# Altium footprint library lib_protel_HC.PCBLIB: 724 footprints (part 40 of 46)
Each footprint in its own frame and in the unit in brackets; x right, y up, seen from the top. Pads: shape width x height; smd on the part's side, far side on the other; paste and mask are expansions set on the pad; w line width, h text height; cw(c..) or ccw(c..) is an arc to the next point about the centre after c.
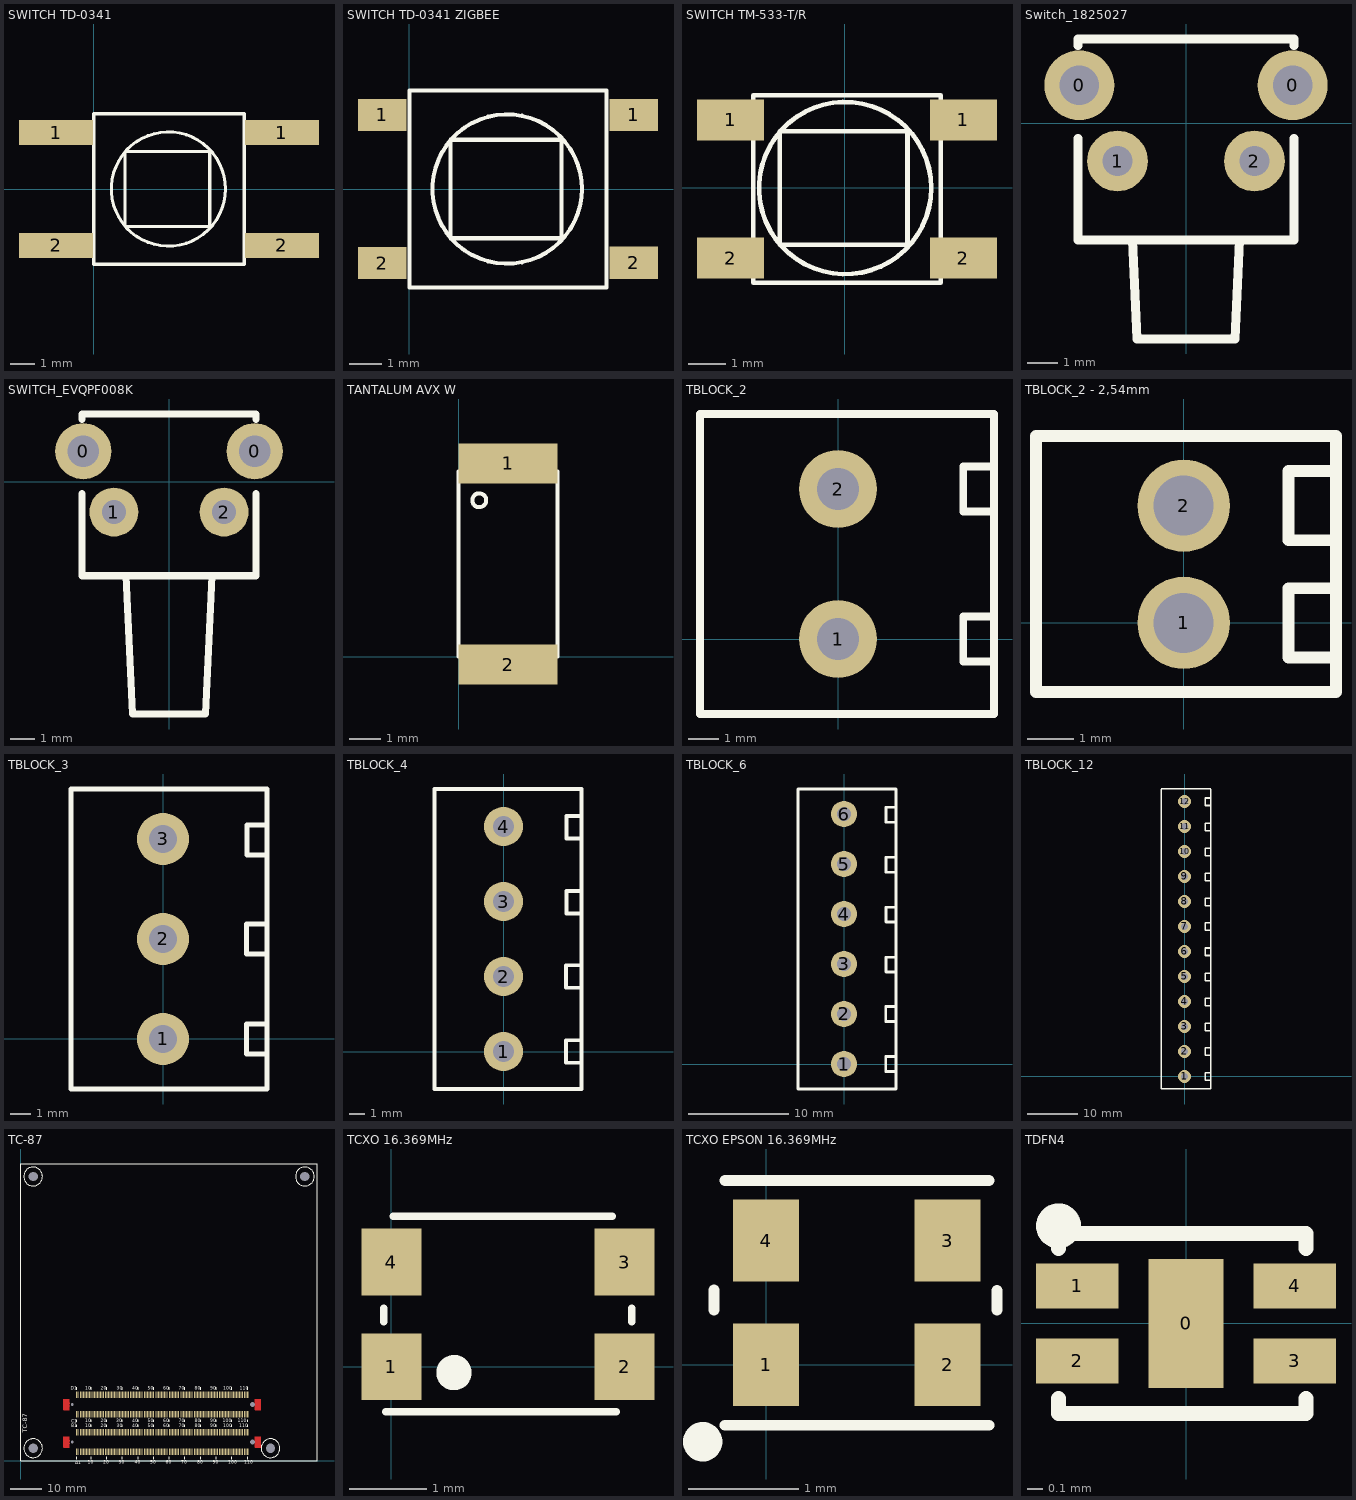
[diagram p39: the footprints below, top view; thin cyan lines are the x and y axes]

## SWITCH TD-0341 [mm] "TACT DE E-COMPONENTS TD-0341"
height 7
pads (4):
  rect 3x1 smd: 1(-1.524,2.286) 1(7.62,2.286) 2(-1.524,-2.286) 2(7.62,-2.286)
Top Overlay:
  circle w0.127: c3.023,0 r2.311
  lines w0.127: 0,-3.048 0,3.048 6.096,3.048 6.096,-3.048 0,-3.048 ; 1.27,-1.524 1.27,1.524 4.699,1.524 4.699,-1.524 1.27,-1.524

## SWITCH TD-0341 ZIGBEE [mm] "TACT DE E-COMPONENTS TD-0341"
height 7
pads (4):
  rect 1.5x1 smd: 1(-0.84,2.29) 1(6.94,2.29) 2(-0.84,-2.29) 2(6.94,-2.286)
Top Overlay:
  circle w0.127: c3.023,0 r2.311
  lines w0.127: 0,-3.048 6.096,-3.048 6.096,3.048 0,3.048 0,-3.048 ; 1.27,-1.524 4.699,-1.524 4.699,1.524 1.27,1.524 1.27,-1.524

## SWITCH TM-533-T/R [mm] "microinterruptor"
height 1.5
pads (4):
  rect 1.8x1.1 smd: 1(-3.068,1.826) 1(3.18,1.826) 2(-3.068,-1.882) 2(3.18,-1.882)
Top Overlay:
  circle w0.127: c0.006,-0.003 r2.311
  lines w0.127: -2.459,-2.543 2.57,-2.543 2.57,2.486 -2.459,2.486 -2.459,-2.543 ; -1.748,-1.527 1.681,-1.527 1.681,1.521 -1.748,1.521 -1.748,-1.527

## Switch_1825027 [mm] "Switch 2 Pin angulo recto"
height 7.01
pads (4):
  round 2.3 hole 1.3: 0(-3.505,1.245) 0(3.505,1.245)
  round 2 hole 0.99: 1(-2.25,-1.245) 2(2.25,-1.245)
Top Overlay:
  lines w0.3: -3.555,-0.5 -3.555,-3.845 3.555,-3.845 3.555,-0.5 ; -3.555,2.55 -3.555,2.765 3.555,2.765 3.555,2.55 ; -1.755,-3.845 -1.605,-7.095 1.605,-7.095 1.755,-3.845
3D body "c-1825027-8-g1-3d.stp": height 7.01, standoff -3.51, extent -4.204,-7.096 4.204,2.746

## SWITCH_EVQPF008K [mm]
height 7.4
pads (4):
  round 2.3 hole 1.3: 0(-3.505,1.245) 0(3.505,1.245)
  round 2 hole 0.99: 1(-2.25,-1.245) 2(2.25,-1.245)
Top Overlay:
  lines w0.3: -3.555,-0.5 -3.555,-3.845 3.555,-3.845 3.555,-0.5 ; -3.555,2.55 -3.555,2.765 3.555,2.765 3.555,2.55 ; -1.755,-3.845 -1.494,-9.5 1.494,-9.5 1.755,-3.845
3D body "c-1-1825027-1-g1-3d.stp": height 7.01, standoff -3.51, extent -4.203,-9.54 4.204,2.817

## TANTALUM AVX W [mm]
pads (2):
  rect 3.2x1.3 smd: 1(1.6,6.25) 2(1.6,-0.25)
Top Overlay:
  circle w0.127: c0.67,5.06 r0.225
  lines w0.127: 0,0 3.2,0 3.2,6 0,6 0,0

## TBLOCK_2 [mm] "TERMIANL BLOCK 2 VIAS"
height 16.5
pads (2):
  round 2.6 hole 1.4: 1(0,0) 2(0,5)
Top Overlay:
  lines w0.254: 5.173,-0.75 4.173,-0.75 4.173,0.75 5.173,0.75 ; 5.173,4.25 4.173,4.25 4.173,5.75 5.173,5.75 ; -4.6,-2.5 -4.6,7.5 5.2,7.5 5.2,-2.5 -4.6,-2.5
3D body "1711026.stp": height 18, standoff -5, extent -5.7,-3.085 5.5,7.485

## TBLOCK_2 - 2,54mm [mm] "TERMIANL BLOCK 2 VIAS 2,54 mm pitch"
height 8
pads (2):
  round 2 hole 1.3: 1(0,0) 2(0,2.54)
Top Overlay:
  lines w0.254: 3.25,0.75 2.273,0.75 2.273,-0.75 3.3,-0.75 ; 3.25,3.29 2.273,3.29 2.273,1.79 3.3,1.79 ; -3.2,-1.5 -3.2,4.05 3.3,4.05 3.3,-1.5 -3.2,-1.5

## TBLOCK_3 [mm] "TERMINAL BLOCK 3 VIAS"
height 16.5
pads (3):
  round 2.6 hole 1.4: 1(0,0) 2(0,5) 3(0,10)
Top Overlay:
  lines w0.254: -4.6,-2.5 5.2,-2.5 5.2,12.5 -4.6,12.5 ; 5.173,-0.75 4.173,-0.75 4.173,0.75 5.173,0.75 ; 5.173,4.25 4.173,4.25 4.173,5.75 5.173,5.75 ; 5.2,9.198 4.2,9.198 4.2,10.698 5.2,10.698
  lines w0.255: -4.6,-2.5 -4.6,12.5
3D body "1711039.stp": height 18, standoff -5, extent -5.7,-3.06 5.5,12.51

## TBLOCK_4 [mm] "TERMINAL BLOCK 4 VIAS"
height 16.5
pads (4):
  round 2.6 hole 1.4: 1(0,0) 2(0,5) 3(0,10) 4(0,15)
Top Overlay:
  lines w0.254: -4.6,-2.5 5.2,-2.5 5.2,17.5 -4.6,17.5 ; 5.173,-0.75 4.173,-0.75 4.173,0.75 5.173,0.75 ; 5.173,4.25 4.173,4.25 4.173,5.75 5.173,5.75 ; 5.2,9.198 4.2,9.198 4.2,10.698 5.2,10.698 ; 5.2,14.198 4.2,14.198 4.2,15.698 5.2,15.698
  lines w0.255: -4.6,-2.5 -4.6,17.5

## TBLOCK_6 [mm] "TERMINAL BLOCK 6 VIAS"
height 16.5
pads (6):
  round 2.6 hole 1.4: 1(0,0) 2(0,5) 3(0,10) 4(0,15) 5(0,20) 6(0,25)
Top Overlay:
  lines w0.254: -4.6,-2.5 5.2,-2.5 5.2,27.5 -4.6,27.5 ; 5.173,-0.75 4.173,-0.75 4.173,0.75 5.173,0.75 ; 5.173,4.25 4.173,4.25 4.173,5.75 5.173,5.75 ; 5.2,9.198 4.2,9.198 4.2,10.698 5.2,10.698 ; 5.2,14.198 4.2,14.198 4.2,15.698 5.2,15.698 ; 5.2,19.166 4.2,19.166 4.2,20.666 5.2,20.666 ; 5.2,24.166 4.2,24.166 4.2,25.666 5.2,25.666
  lines w0.255: -4.6,-2.5 -4.6,27.5

## TBLOCK_12 [mm] "TERMINAL BLOCK 6 VIAS"
height 16.5
pads (12):
  round 2.6 hole 1.4: 1(0,0) 2(0,5) 3(0,10) 4(0,15) 5(0,20) 6(0,25) 7(0,30) 8(0,35) 9(0,40) 10(0,45) 11(0,50) 12(0,55)
Top Overlay:
  lines w0.254: -4.6,-2.5 5.2,-2.5 5.2,57.5 -4.6,57.5 ; 5.173,-0.75 4.173,-0.75 4.173,0.75 5.173,0.75 ; 5.173,4.25 4.173,4.25 4.173,5.75 5.173,5.75 ; 5.173,24.25 4.173,24.25 4.173,25.75 5.173,25.75 ; 5.173,29.25 4.173,29.25 4.173,30.75 5.173,30.75 ; 5.173,54.25 4.173,54.25 4.173,55.75 5.173,55.75 ; 5.2,9.198 4.2,9.198 4.2,10.698 5.2,10.698 ; 5.2,14.198 4.2,14.198 4.2,15.698 5.2,15.698 ; 5.2,19.166 4.2,19.166 4.2,20.666 5.2,20.666 ; 5.2,24.166 4.2,24.166 4.2,25.666 5.2,25.666 ; 5.2,34.198 4.2,34.198 4.2,35.698 5.2,35.698 ; 5.2,39.198 4.2,39.198 4.2,40.698 5.2,40.698 ; 5.2,44.166 4.2,44.166 4.2,45.666 5.2,45.666 ; 5.2,49.166 4.2,49.166 4.2,50.666 5.2,50.666 ; 5.2,54.166 4.2,54.166 4.2,55.666 5.2,55.666
  lines w0.255: -4.6,-2.5 -4.6,57.5

## TC-87 [mm] "TC-87"
height 25
pads (448):
  rect 0x0 hole 3: 0(4,4) 0(4,91) 0(80,4) 0(91,91)
  rect 0x0 hole 0.9: 0(16.5,6) 0(16.5,18)
  rect 0x0 hole 1.6: 0(74.2,6) 0(74.2,18)
  rect 0.45x2 smd: A1(18.025,2.9) A110(72.675,2.9) B1(18.025,9.1) B110(72.675,9.1) C1(18.025,14.9) C110(72.675,14.9) D1(18.025,21.1) D110(72.675,21.1)
  rect 0.3x2 smd: A2(18.6,2.9) A3(19.1,2.9) A4(19.6,2.9) A5(20.1,2.9) A6(20.6,2.9) A7(21.1,2.9) A8(21.6,2.9) A9(22.1,2.9) A10(22.6,2.9) A11(23.1,2.9) A12(23.6,2.9) A13(24.1,2.9) A14(24.6,2.9) A15(25.1,2.9) A16(25.6,2.9) A17(26.1,2.9) A18(26.6,2.9) A19(27.1,2.9) A20(27.6,2.9) A21(28.1,2.9) A22(28.6,2.9) A23(29.1,2.9) A24(29.6,2.9) A25(30.1,2.9) A26(30.6,2.9) A27(31.1,2.9) A28(31.6,2.9) A29(32.1,2.9) A30(32.6,2.9) A31(33.1,2.9) A32(33.6,2.9) A33(34.1,2.9) A34(34.6,2.9) A35(35.1,2.9) A36(35.6,2.9) A37(36.1,2.9) A38(36.6,2.9) A39(37.1,2.9) A40(37.6,2.9) A41(38.1,2.9) A42(38.6,2.9) A43(39.1,2.9) A44(39.6,2.9) A45(40.1,2.9) A46(40.6,2.9) A47(41.1,2.9) A48(41.6,2.9) A49(42.1,2.9) A50(42.6,2.9) A51(43.1,2.9) A52(43.6,2.9) A53(44.1,2.9) A54(44.6,2.9) A55(45.1,2.9) A56(45.6,2.9) A57(46.1,2.9) A58(46.6,2.9) A59(47.1,2.9) A60(47.6,2.9) A61(48.1,2.9) A62(48.6,2.9) A63(49.1,2.9) A64(49.6,2.9) A65(50.1,2.9) A66(50.6,2.9) A67(51.1,2.9) A68(51.6,2.9) A69(52.1,2.9) A70(52.6,2.9) A71(53.1,2.9) A72(53.6,2.9) A73(54.1,2.9) A74(54.6,2.9) A75(55.1,2.9) A76(55.6,2.9) A77(56.1,2.9) A78(56.6,2.9) A79(57.1,2.9) A80(57.6,2.9) A81(58.1,2.9) A82(58.6,2.9) A83(59.1,2.9) A84(59.6,2.9) A85(60.1,2.9) A86(60.6,2.9) A87(61.1,2.9) A88(61.6,2.9) A89(62.1,2.9) A90(62.6,2.9) A91(63.1,2.9) A92(63.6,2.9) A93(64.1,2.9) A94(64.6,2.9) A95(65.1,2.9) A96(65.6,2.9) A97(66.1,2.9) A98(66.6,2.9) A99(67.1,2.9) A100(67.6,2.9) A101(68.1,2.9) A102(68.6,2.9) A103(69.1,2.9) A104(69.6,2.9) A105(70.1,2.9) A106(70.6,2.9) A107(71.1,2.9) A108(71.6,2.9) A109(72.1,2.9) B2(18.6,9.1) B3(19.1,9.1) B4(19.6,9.1) B5(20.1,9.1) B6(20.6,9.1) B7(21.1,9.1) B8(21.6,9.1) B9(22.1,9.1) B10(22.6,9.1) B11(23.1,9.1) B12(23.6,9.1) B13(24.1,9.1) B14(24.6,9.1) B15(25.1,9.1) B16(25.6,9.1) B17(26.1,9.1) B18(26.6,9.1) B19(27.1,9.1) B20(27.6,9.1) B21(28.1,9.1) B22(28.6,9.1) B23(29.1,9.1) B24(29.6,9.1) B25(30.1,9.1) B26(30.6,9.1) B27(31.1,9.1) B28(31.6,9.1) B29(32.1,9.1) B30(32.6,9.1) B31(33.1,9.1) B32(33.6,9.1) B33(34.1,9.1) B34(34.6,9.1) B35(35.1,9.1) B36(35.6,9.1) B37(36.1,9.1) B38(36.6,9.1) B39(37.1,9.1) B40(37.6,9.1) B41(38.1,9.1) B42(38.6,9.1) B43(39.1,9.1) B44(39.6,9.1) B45(40.1,9.1) B46(40.6,9.1) B47(41.1,9.1) B48(41.6,9.1) B49(42.1,9.1) B50(42.6,9.1) B51(43.1,9.1) B52(43.6,9.1) B53(44.1,9.1) B54(44.6,9.1) B55(45.1,9.1) B56(45.6,9.1) B57(46.1,9.1) B58(46.6,9.1) B59(47.1,9.1) B60(47.6,9.1) B61(48.1,9.1) B62(48.6,9.1) B63(49.1,9.1) B64(49.6,9.1) B65(50.1,9.1) B66(50.6,9.1) B67(51.1,9.1) B68(51.6,9.1) B69(52.1,9.1) B70(52.6,9.1) B71(53.1,9.1) B72(53.6,9.1) B73(54.1,9.1) B74(54.6,9.1) B75(55.1,9.1) B76(55.6,9.1) B77(56.1,9.1) B78(56.6,9.1) B79(57.1,9.1) B80(57.6,9.1) B81(58.1,9.1) B82(58.6,9.1) B83(59.1,9.1) B84(59.6,9.1) B85(60.1,9.1) B86(60.6,9.1) B87(61.1,9.1) B88(61.6,9.1) B89(62.1,9.1) B90(62.6,9.1) B91(63.1,9.1) B92(63.6,9.1) B93(64.1,9.1) B94(64.6,9.1) B95(65.1,9.1) B96(65.6,9.1) B97(66.1,9.1) B98(66.6,9.1) B99(67.1,9.1) B100(67.6,9.1) B101(68.1,9.1) B102(68.6,9.1) B103(69.1,9.1) B104(69.6,9.1) B105(70.1,9.1) B106(70.6,9.1) B107(71.1,9.1) B108(71.6,9.1) B109(72.1,9.1) C2(18.6,14.9) C3(19.1,14.9) C4(19.6,14.9) C5(20.1,14.9) C6(20.6,14.9) C7(21.1,14.9) C8(21.6,14.9) C9(22.1,14.9) C10(22.6,14.9) C11(23.1,14.9) C12(23.6,14.9) C13(24.1,14.9) C14(24.6,14.9) C15(25.1,14.9) C16(25.6,14.9) C17(26.1,14.9) C18(26.6,14.9) C19(27.1,14.9) C20(27.6,14.9) C21(28.1,14.9) C22(28.6,14.9) C23(29.1,14.9) C24(29.6,14.9) C25(30.1,14.9) C26(30.6,14.9) C27(31.1,14.9) C28(31.6,14.9) C29(32.1,14.9) C30(32.6,14.9) C31(33.1,14.9) C32(33.6,14.9) C33(34.1,14.9) C34(34.6,14.9) C35(35.1,14.9) C36(35.6,14.9) C37(36.1,14.9) C38(36.6,14.9) C39(37.1,14.9) C40(37.6,14.9) C41(38.1,14.9) C42(38.6,14.9) C43(39.1,14.9) C44(39.6,14.9) C45(40.1,14.9) C46(40.6,14.9) C47(41.1,14.9) C48(41.6,14.9) C49(42.1,14.9) C50(42.6,14.9) C51(43.1,14.9) C52(43.6,14.9) C53(44.1,14.9) C54(44.6,14.9) C55(45.1,14.9) C56(45.6,14.9) C57(46.1,14.9) C58(46.6,14.9) C59(47.1,14.9) C60(47.6,14.9) C61(48.1,14.9) C62(48.6,14.9) C63(49.1,14.9) C64(49.6,14.9) C65(50.1,14.9) C66(50.6,14.9) C67(51.1,14.9) C68(51.6,14.9) C69(52.1,14.9) C70(52.6,14.9) C71(53.1,14.9) C72(53.6,14.9) C73(54.1,14.9) C74(54.6,14.9) C75(55.1,14.9) C76(55.6,14.9) C77(56.1,14.9) C78(56.6,14.9) C79(57.1,14.9) C80(57.6,14.9) C81(58.1,14.9) C82(58.6,14.9) C83(59.1,14.9) C84(59.6,14.9) C85(60.1,14.9) C86(60.6,14.9) C87(61.1,14.9) C88(61.6,14.9) C89(62.1,14.9) C90(62.6,14.9) C91(63.1,14.9) C92(63.6,14.9) C93(64.1,14.9) C94(64.6,14.9) C95(65.1,14.9) C96(65.6,14.9) C97(66.1,14.9) C98(66.6,14.9) C99(67.1,14.9) C100(67.6,14.9) C101(68.1,14.9) C102(68.6,14.9) C103(69.1,14.9) C104(69.6,14.9) C105(70.1,14.9) C106(70.6,14.9) C107(71.1,14.9) C108(71.6,14.9) C109(72.1,14.9) D2(18.6,21.1) D3(19.1,21.1) D4(19.6,21.1) D5(20.1,21.1) D6(20.6,21.1) D7(21.1,21.1) D8(21.6,21.1) D9(22.1,21.1) D10(22.6,21.1) D11(23.1,21.1) D12(23.6,21.1) D13(24.1,21.1) D14(24.6,21.1) D15(25.1,21.1) D16(25.6,21.1) D17(26.1,21.1) D18(26.6,21.1) D19(27.1,21.1) D20(27.6,21.1) D21(28.1,21.1) D22(28.6,21.1) D23(29.1,21.1) D24(29.6,21.1) D25(30.1,21.1) D26(30.6,21.1) D27(31.1,21.1) D28(31.6,21.1) D29(32.1,21.1) D30(32.6,21.1) D31(33.1,21.1) D32(33.6,21.1) D33(34.1,21.1) D34(34.6,21.1) D35(35.1,21.1) D36(35.6,21.1) D37(36.1,21.1) D38(36.6,21.1) D39(37.1,21.1) D40(37.6,21.1) D41(38.1,21.1) D42(38.6,21.1) D43(39.1,21.1) D44(39.6,21.1) D45(40.1,21.1) D46(40.6,21.1) D47(41.1,21.1) D48(41.6,21.1) D49(42.1,21.1) D50(42.6,21.1) D51(43.1,21.1) D52(43.6,21.1) D53(44.1,21.1) D54(44.6,21.1) D55(45.1,21.1) D56(45.6,21.1) D57(46.1,21.1) D58(46.6,21.1) D59(47.1,21.1) D60(47.6,21.1) D61(48.1,21.1) D62(48.6,21.1) D63(49.1,21.1) D64(49.6,21.1) D65(50.1,21.1) D66(50.6,21.1) D67(51.1,21.1) D68(51.6,21.1) D69(52.1,21.1) D70(52.6,21.1) D71(53.1,21.1) D72(53.6,21.1) D73(54.1,21.1) D74(54.6,21.1) D75(55.1,21.1) D76(55.6,21.1) D77(56.1,21.1) D78(56.6,21.1) D79(57.1,21.1) D80(57.6,21.1) D81(58.1,21.1) D82(58.6,21.1) D83(59.1,21.1) D84(59.6,21.1) D85(60.1,21.1) D86(60.6,21.1) D87(61.1,21.1) D88(61.6,21.1) D89(62.1,21.1) D90(62.6,21.1) D91(63.1,21.1) D92(63.6,21.1) D93(64.1,21.1) D94(64.6,21.1) D95(65.1,21.1) D96(65.6,21.1) D97(66.1,21.1) D98(66.6,21.1) D99(67.1,21.1) D100(67.6,21.1) D101(68.1,21.1) D102(68.6,21.1) D103(69.1,21.1) D104(69.6,21.1) D105(70.1,21.1) D106(70.6,21.1) D107(71.1,21.1) D108(71.6,21.1) D109(72.1,21.1)
Top Layer:
  region: 76.875,7.65 76.875,4.35 75.078,4.35 75.078,5.415 75.151,5.541 75.238,5.819 75.241,6.11 75.16,6.39 75.09,6.518 75.09,7.65
  region: 13.825,4.35 13.825,7.65 15.622,7.65 15.622,6.585 15.549,6.459 15.462,6.181 15.459,5.89 15.54,5.61 15.61,5.482 15.61,4.35
  region: 13.825,16.35 13.825,19.65 15.622,19.65 15.622,18.585 15.549,18.459 15.462,18.181 15.459,17.89 15.54,17.61 15.61,17.482 15.61,16.35
  region: 76.875,19.65 76.875,16.35 75.078,16.35 75.078,17.415 75.151,17.541 75.238,17.819 75.241,18.11 75.16,18.39 75.09,18.518 75.09,19.65
  lines w0.1: 13.825,4.35 15.61,4.35 15.61,5.482 cw(c16.45,6.025) 15.622,6.585 15.622,7.65 13.825,7.65 13.825,4.35 ; 13.825,16.35 13.825,19.65 15.622,19.65 15.622,18.585 ccw(c16.45,18.025) 15.61,17.482 15.61,16.35 13.825,16.35 ; 75.078,4.35 75.078,5.415 ccw(c74.25,5.975) 75.09,6.518 75.09,7.65 76.875,7.65 76.875,4.35 75.078,4.35 ; 75.078,16.35 76.875,16.35 76.875,19.65 75.09,19.65 75.09,18.518 cw(c74.25,17.975) 75.078,17.415 75.078,16.35
Top Overlay:
  circle w0.254: c91,91 r3
  circle w0.254: c4,91 r3
  circle w0.254: c80,4 r3
  circle w0.254: c4,4 r3
  lines w0.1: 18.025,0.425 18.025,1.2 ; 18.025,10.8 18.025,11.575 ; 18.025,12.4 18.025,13.175 ; 18.025,22.8 18.025,23.575 ; 22.6,0.425 22.6,1.2 ; 22.6,10.8 22.6,11.575 ; 22.6,12.4 22.6,13.175 ; 22.6,22.8 22.6,23.575 ; 27.6,0.425 27.6,1.2 ; 27.6,10.8 27.6,11.575 ; 27.6,12.4 27.6,13.175 ; 27.6,22.8 27.6,23.575 ; 32.6,0.425 32.6,1.2 ; 32.6,10.8 32.6,11.575 ; 32.6,12.4 32.6,13.175 ; 32.6,22.8 32.6,23.575 ; 37.6,0.425 37.6,1.2 ; 37.6,10.8 37.6,11.575 ; 37.6,12.4 37.6,13.175 ; 37.6,22.8 37.6,23.575 ; 42.6,0.425 42.6,1.2 ; 42.6,10.8 42.6,11.575 ; 42.6,12.4 42.6,13.175 ; 42.6,22.8 42.6,23.575 ; 47.6,0.425 47.6,1.2 ; 47.6,10.8 47.6,11.575 ; 47.6,12.4 47.6,13.175 ; 47.6,22.8 47.6,23.575 ; 52.6,0.425 52.6,1.2 ; 52.6,10.8 52.6,11.575 ; 52.6,12.4 52.6,13.175 ; 52.6,22.8 52.6,23.575 ; 57.6,0.425 57.6,1.2 ; 57.6,10.8 57.6,11.575 ; 57.6,12.4 57.6,13.175 ; 57.6,22.8 57.6,23.575 ; 62.6,0.425 62.6,1.2 ; 62.6,10.8 62.6,11.575 ; 62.6,12.4 62.6,13.175 ; 62.6,22.8 62.6,23.575 ; 67.6,0.425 67.6,1.2 ; 67.6,10.8 67.6,11.575 ; 67.6,12.4 67.6,13.175 ; 67.6,22.8 67.6,23.575 ; 72.675,0.425 72.675,1.2 ; 72.675,10.8 72.675,11.575 ; 72.675,22.8 72.675,23.575 ; 72.7,12.4 72.7,13.175 ; 0,0 95,0 95,95 0,95 0,0
  text "10" at 20.7,22.7 h1
  text "20" at 25.7,22.7 h1
  text "30" at 30.7,22.7 h1
  text "40" at 35.7,22.7 h1
  text "50" at 40.7,22.7 h1
  text "60" at 45.7,22.7 h1
  text "70" at 50.7,22.7 h1
  text "80" at 55.7,22.7 h1
  text "90" at 60.7,22.7 h1
  text "100" at 64.8,22.7 h1
  text "110" at 70.075,22.7 h1
  text "D1" at 16,22.65 h1
  text "110" at 69.55,12.3 h1
  text "100" at 64.775,12.3 h1
  text "90" at 60.675,12.3 h1
  text "80" at 55.675,12.3 h1
  text "70" at 50.675,12.3 h1
  text "60" at 45.675,12.3 h1
  text "50" at 40.675,12.3 h1
  text "40" at 35.675,12.3 h1
  text "30" at 30.675,12.3 h1
  text "20" at 25.675,12.3 h1
  text "10" at 20.675,12.3 h1
  text "10" at 20.7,10.675 h1
  text "20" at 25.7,10.675 h1
  text "30" at 30.7,10.675 h1
  text "40" at 35.7,10.675 h1
  text "50" at 40.7,10.675 h1
  text "60" at 45.7,10.675 h1
  text "70" at 50.7,10.675 h1
  text "80" at 55.7,10.675 h1
  text "90" at 60.7,10.675 h1
  text "100" at 64.8,10.675 h1
  text "110" at 70.05,10.675 h1
  text "C1" at 16.175,12.225 h1
  text "B1" at 16.175,10.675 h1
  text "110" at 71.55,-1.025 h1
  text "100" at 66.475,-1.025 h1
  text "90" at 61.475,-1.025 h1
  text "80" at 56.475,-1.025 h1
  text "70" at 51.475,-1.025 h1
  text "60" at 46.475,-1.025 h1
  text "50" at 41.475,-1.025 h1
  text "40" at 36.475,-1.025 h1
  text "30" at 31.475,-1.025 h1
  text "20" at 26.475,-1.025 h1
  text "10" at 21.475,-1.025 h1
  text "A1" at 17.5,-1.05 h1
  text "TC-87" at 2.075,8.95 h1.5

## TCXO 16.369MHz [mm] "TCXO para GPS Telit SE880"
height 1
pads (4):
  rect 0.78x0.87 smd: 1(0,0) 2(3.03,0) 3(3.03,1.36) 4(0,1.36)
Top Overlay:
  circle w0.254: c0.813,-0.076 r0.102
  lines w0.1: -0.102,0.584 -0.102,0.762 ; -0.076,-0.584 2.921,-0.584 ; 0.025,1.956 2.87,1.956 ; 3.124,0.584 3.124,0.762

## TCXO EPSON 16.369MHz [mm] "TCXO para GPS Telit SE880"
height 1
pads (4):
  rect 0.6x0.75 smd: 1(0,0) 2(1.65,0) 3(1.65,1.13) 4(0,1.13)
Top Overlay:
  circle w0.254: c-0.577,-0.7 r0.052
  lines w0.1: -0.475,0.5 -0.475,0.678 ; -0.375,-0.55 2.025,-0.55 ; -0.375,1.675 2.025,1.675 ; 2.1,0.497 2.1,0.675
3D body: height 0.73, standoff 0.7, extent -0.175,-0.235 1.825,1.365
3D body: height 0.7, standoff 0, extent -0.175,-0.235 1.825,1.365

## TDFN4 [mm]
height 0.55
pads (5):
  rect 0.5x0.86 smd mask+0.05: 0(0,0)
  rect 0.55x0.3 smd mask+0.05: 1(-0.725,0.25) 2(-0.725,-0.25) 3(0.725,-0.25) 4(0.725,0.25)
Top Overlay:
  circle w0.15: c-0.85,0.65 r0.075
  lines w0.1: -0.85,-0.5 -0.85,-0.6 0.8,-0.6 0.8,-0.5 ; -0.85,0.5 -0.85,0.6 0.8,0.6 0.8,0.5
3D body: height 0.55, standoff 0, extent -0.85,-0.6 0.8,0.6